# Altium footprint library IC.PCBLIB: 359 footprints (part 13 of 23)
Each footprint in its own frame and in the unit in brackets; x right, y up, seen from the top. Pads: shape width x height; smd on the part's side, far side on the other; paste and mask are expansions set on the pad; w line width, h text height; cw(c..) or ccw(c..) is an arc to the next point about the centre after c.
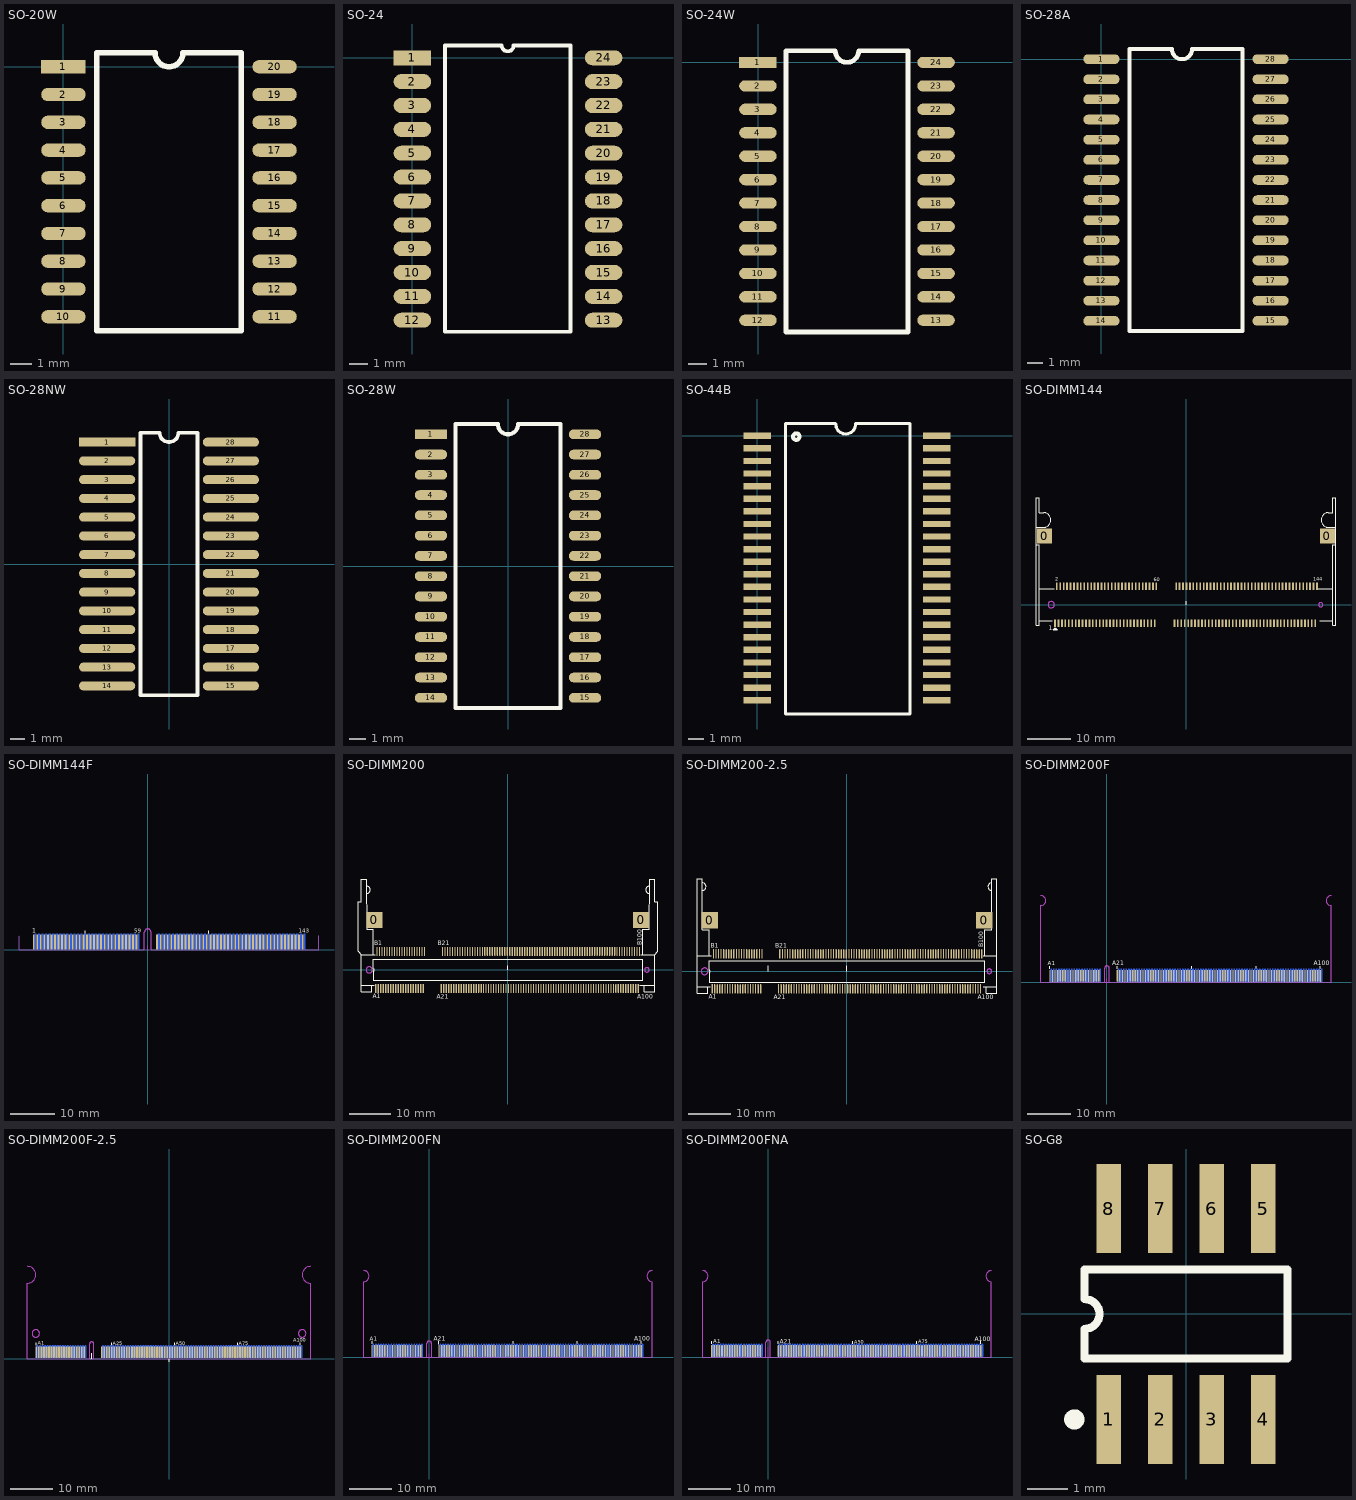
[diagram p12: the footprints below, top view; thin cyan lines are the x and y axes]

## SO-20W [mil]
pads (20):
  rect 80x24 smd: 1(0,0)
  oval 80x24 smd: 2(0,-50) 3(0,-100) 4(0,-150) 5(0,-200) 6(0,-250) 7(0,-300) 8(0,-350) 9(0,-400) 10(0,-450) 11(380,-450) 12(380,-400) 13(380,-350) 14(380,-300) 15(380,-250) 16(380,-200) 17(380,-150) 18(380,-100) 19(380,-50) 20(380,0)
TopOverlay:
  lines w10: 60,-475 320,-475 320,25 215,25 cw(c190,25) 165,25 60,25 60,-475

## SO-24 [mm]
pads (24):
  rect 2x0.8 smd: 1(0,0)
  oval 2x0.8 smd: 2(0,-1.27) 3(0,-2.54) 4(0,-3.81) 5(0,-5.08) 6(0,-6.35) 7(0,-7.62) 8(0,-8.89) 9(0,-10.16) 10(0,-11.43) 11(0,-12.7) 12(0,-13.97) 13(10.172,-13.97) 14(10.172,-12.7) 15(10.172,-11.43) 16(10.172,-10.16) 17(10.172,-8.89) 18(10.172,-7.62) 19(10.172,-6.35) 20(10.172,-5.08) 21(10.172,-3.81) 22(10.172,-2.54) 23(10.172,-1.27) 24(10.172,0)
TopOverlay:
  lines w0.2: 1.727,-14.58 8.407,-14.58 8.407,0.66 5.385,0.66 cw(c5.067,0.66) 4.75,0.66 1.727,0.66 1.727,-14.58

## SO-24W [mil]
pads (24):
  rect 80x24 smd: 1(-1,0)
  oval 80x24 smd: 2(-1,-50) 3(-1,-100) 4(-1,-150) 5(-1,-200) 6(-1,-250) 7(-1,-300) 8(-1,-350) 9(-1,-400) 10(-1,-450) 11(-1,-500) 12(-1,-550) 13(379,-550) 14(379,-500) 15(379,-450) 16(379,-400) 17(379,-350) 18(379,-300) 19(379,-250) 20(379,-200) 21(379,-150) 22(379,-100) 23(379,-50) 24(379,0)
TopOverlay:
  lines w10: 59,-575 319,-575 319,25 214,25 cw(c189,25) 164,25 59,25 59,-575

## SO-28A [mil]
pads (28):
  oval 90x24 smd: 1(0,0) 2(0,-50) 3(0,-100) 4(0,-150) 5(0,-200) 6(0,-250) 7(0,-300) 8(0,-350) 9(0,-400) 10(0,-450) 11(0,-500) 12(0,-550) 13(0,-600) 14(0,-650) 15(420,-650) 16(420,-600) 17(420,-550) 18(420,-500) 19(420,-450) 20(420,-400) 21(420,-350) 22(420,-300) 23(420,-250) 24(420,-200) 25(420,-150) 26(420,-100) 27(420,-50) 28(420,0)
TopOverlay:
  lines w10: 70,-675 350,-675 350,25 225,25 cw(c200,25) 175,25 70,25 70,-675

## SO-28NW [mil]
height 590.55
pads (28):
  rect 150x24 smd: 1(-165,325)
  oval 150x24 smd: 2(-165,275) 3(-165,225) 4(-165,175) 5(-165,125) 6(-165,75) 7(-165,25) 8(-165,-25) 9(-165,-75) 10(-165,-125) 11(-165,-175) 12(-165,-225) 13(-165,-275) 14(-165,-325) 15(165,-325) 16(165,-275) 17(165,-225) 18(165,-175) 19(165,-125) 20(165,-75) 21(165,-25) 22(165,25) 23(165,75) 24(165,125) 25(165,175) 26(165,225) 27(165,275) 28(165,325)
TopOverlay:
  lines w10: -76.3,350 -76.3,-350 76.3,-350 76.3,350 25,350 cw(c0,350) -25,350 -75,350

## SO-28W [mil]
pads (28):
  rect 80x24 smd: 1(-190,325)
  oval 80x24 smd: 2(-190,275) 3(-190,225) 4(-190,175) 5(-190,125) 6(-190,75) 7(-190,25) 8(-190,-25) 9(-190,-75) 10(-190,-125) 11(-190,-175) 12(-190,-225) 13(-190,-275) 14(-190,-325) 15(190,-325) 16(190,-275) 17(190,-225) 18(190,-175) 19(190,-125) 20(190,-75) 21(190,-25) 22(190,25) 23(190,75) 24(190,125) 25(190,175) 26(190,225) 27(190,275) 28(190,325)
TopOverlay:
  lines w10: -130,-350 130,-350 130,350 25,350 cw(c0,350) -25,350 -130,350 -130,-350

## SO-44B [mm]
pads (44):
  rect 1.75x0.4 smd: 1(0,0) 2(0,-0.8) 3(0,-1.6) 4(0,-2.4) 5(0,-3.2) 6(0,-4) 7(0,-4.8) 8(0,-5.6) 9(0,-6.4) 10(0,-7.2) 11(0,-8) 12(0,-8.8) 13(0,-9.6) 14(0,-10.4) 15(0,-11.2) 16(0,-12) 17(0,-12.8) 18(0,-13.6) 19(0,-14.4) 20(0,-15.2) 21(0,-16) 22(0,-16.8) 23(11.43,-16.8) 24(11.43,-16) 25(11.43,-15.2) 26(11.43,-14.4) 27(11.43,-13.6) 28(11.43,-12.8) 29(11.43,-12) 30(11.43,-11.2) 31(11.43,-10.4) 32(11.43,-9.6) 33(11.43,-8.8) 34(11.43,-8) 35(11.43,-7.2) 36(11.43,-6.4) 37(11.43,-5.6) 38(11.43,-4.8) 39(11.43,-4) 40(11.43,-3.2) 41(11.43,-2.4) 42(11.43,-1.6) 43(11.43,-0.8) 44(11.43,0)
TopOverlay:
  circle w0.25: c2.487,-0.051 r0.205
  lines w0.2: 4.978,0.784 1.803,0.784 1.803,-17.673 9.723,-17.673 9.723,0.784 6.248,0.784 ; 4.998,0.749 ccw(c5.633,0.749) 6.268,0.749

## SO-DIMM144 [mil]
pads (146):
  rect 137.8x137.8 smd: 0(-1298.05,630) 0(1298.05,630)
  rect 16x66 smd: 1(-1201.04,-170) 2(-1185.29,170) 3(-1169.55,-170) 4(-1153.8,170) 5(-1138.05,-170) 6(-1122.3,170) 7(-1106.55,-170) 8(-1090.81,170) 9(-1075.06,-170) 10(-1059.31,170) 11(-1043.56,-170) 12(-1027.81,170) 13(-1012.07,-170) 14(-996.32,170) 15(-980.57,-170) 16(-964.82,170) 17(-949.07,-170) 18(-933.33,170) 19(-917.58,-170) 20(-901.83,170) 21(-886.08,-170) 22(-870.33,170) 23(-854.59,-170) 24(-838.84,170) 25(-823.09,-170) 26(-807.34,170) 27(-791.59,-170) 28(-775.85,170) 29(-760.1,-170) 30(-744.35,170) 31(-728.6,-170) 32(-712.85,170) 33(-697.11,-170) 34(-681.36,170) 35(-665.61,-170) 36(-649.86,170) 37(-634.11,-170) 38(-618.37,170) 39(-602.62,-170) 40(-586.87,170) 41(-571.12,-170) 42(-555.37,170) 43(-539.63,-170) 44(-523.88,170) 45(-508.13,-170) 46(-492.38,170) 47(-476.63,-170) 48(-460.89,170) 49(-445.14,-170) 50(-429.39,170) 51(-413.64,-170) 52(-397.89,170) 53(-382.15,-170) 54(-366.4,170) 55(-350.65,-170) 56(-334.9,170) 57(-319.15,-170) 58(-303.41,170) 59(-287.66,-170) 60(-271.91,170) 61(-106.04,-170) 62(-90.29,170) 63(-74.55,-170) 64(-58.8,170) 65(-43.05,-170) 66(-27.3,170) 67(-11.55,-170) 68(4.19,170) 69(19.94,-170) 70(35.69,170) 71(51.44,-170) 72(67.19,170) 73(82.93,-170) 74(98.68,170) 75(114.43,-170) 76(130.18,170) 77(145.93,-170) 78(161.67,170) 79(177.42,-170) 80(193.17,170) 81(208.92,-170) 82(224.67,170) 83(240.41,-170) 84(256.16,170) 85(271.91,-170) 86(287.66,170) 87(303.41,-170) 88(319.15,170) 89(334.9,-170) 90(350.65,170) 91(366.4,-170) 92(382.15,170) 93(397.89,-170) 94(413.64,170) 95(429.39,-170) 96(445.14,170) 97(460.89,-170) 98(476.63,170) 99(492.38,-170) 100(508.13,170) 101(523.88,-170) 102(539.63,170) 103(555.37,-170) 104(571.12,170) 105(586.87,-170) 106(602.62,170) 107(618.37,-170) 108(634.11,170) 109(649.86,-170) 110(665.61,170) 111(681.36,-170) 112(697.11,170) 113(712.85,-170) 114(728.6,170) 115(744.35,-170) 116(760.1,170) 117(775.85,-170) 118(791.59,170) 119(807.34,-170) 120(823.09,170) 121(838.84,-170) 122(854.59,170) 123(870.33,-170) 124(886.08,170) 125(901.83,-170) 126(917.58,170) 127(933.33,-170) 128(949.07,170) 129(964.82,-170) 130(980.57,170) 131(996.32,-170) 132(1012.07,170) 133(1027.81,-170) 134(1043.56,170) 135(1059.31,-170) 136(1075.06,170) 137(1090.81,-170) 138(1106.55,170) 139(1122.3,-170) 140(1138.05,170) 141(1153.8,-170) 142(1169.55,170) 143(1185.29,-170) 144(1201.04,170)
TopOverlay:
  rectangle: -1208.05,-230 -1192.05,-218
  lines w10: -1375.05,710 -1346.05,710 -1306.05,710 ccw(c-1306.05,777) -1306.05,844 -1346.05,844 ; -1374.05,550 -1346.05,550 -1346.05,-190 -1376.05,-190 -1376.05,980 -1346.05,980 -1346.05,845 ; -1346.05,-146.46 -1226.05,-146.46 ; -1346.05,147 -1206.59,147 ; 0,0 0,32 ; 1206.59,147 1346.05,147 ; 1226.05,-146.46 1346.05,-146.46 ; 1346.05,844 1306.05,844 ccw(c1306.05,777) 1306.05,710 1346.05,710 1375.05,710 ; 1346.05,845 1346.05,980 1376.05,980 1376.05,-190 1346.05,-190 1346.05,550 1374.05,550 ; 1375.92,-146.46 1375.92,146.46 ; -1218.05,-230 -1200.05,-212 -1182.05,-230 -1218.05,-230
  text "144" at 1168.95,220 h35
  text "2" at -1198.05,221 h35
  text "1" at -1259.05,-233 h40
  text "60" at -294.05,216 h35
KeepOutLayer:
  circle w5: c-1236.22,0 r29.53
  circle w5: c1236.22,0 r19.68
Mechanical1:
  circle w5: c-1236.22,0 r29.53
  circle w5: c1236.22,0 r19.68

## SO-DIMM144F [mil]
pads (144):
  rect 16x130 smd: 1(-1012,70) 3(-980.5,70) 5(-949.01,70) 7(-917.51,70) 9(-886.02,70) 11(-854.52,70) 13(-823.02,70) 15(-791.53,70) 17(-760.03,70) 19(-728.54,70) 21(-697.04,70) 23(-665.54,70) 25(-634.05,70) 27(-602.55,70) 29(-571.06,70) 31(-539.56,70) 33(-508.06,70) 35(-476.57,70) 37(-445.07,70) 39(-413.58,70) 41(-382.08,70) 43(-350.58,70) 45(-319.09,70) 47(-287.59,70) 49(-256.1,70) 51(-224.6,70) 53(-193.1,70) 55(-161.61,70) 57(-130.11,70) 59(-98.62,70) 61(83,70) 63(114.5,70) 65(145.99,70) 67(177.49,70) 69(208.98,70) 71(240.48,70) 73(271.98,70) 75(303.47,70) 77(334.97,70) 79(366.46,70) 81(397.96,70) 83(429.46,70) 85(460.95,70) 87(492.45,70) 89(523.94,70) 91(555.44,70) 93(586.94,70) 95(618.43,70) 97(649.93,70) 99(681.42,70) 101(712.92,70) 103(744.42,70) 105(775.91,70) 107(807.41,70) 109(838.9,70) 111(870.4,70) 113(901.9,70) 115(933.39,70) 117(964.89,70) 119(996.38,70) 121(1027.88,70) 123(1059.38,70) 125(1090.87,70) 127(1122.37,70) 129(1153.86,70) 131(1185.36,70) 133(1216.86,70) 135(1248.35,70) 137(1279.85,70) 139(1311.34,70) 141(1342.84,70) 143(1374.34,70)
  rect 16x140 smd far side: 2(-996.25,75) 4(-964.76,75) 6(-933.26,75) 8(-901.76,75) 10(-870.27,75) 12(-838.77,75) 14(-807.28,75) 16(-775.78,75) 18(-744.28,75) 20(-712.79,75) 22(-681.29,75) 24(-649.8,75) 26(-618.3,75) 28(-586.8,75) 30(-555.31,75) 32(-523.81,75) 34(-492.32,75) 36(-460.82,75) 38(-429.32,75) 40(-397.83,75) 42(-366.33,75) 44(-334.84,75) 46(-303.34,75) 48(-271.84,75) 50(-240.35,75) 52(-208.85,75) 54(-177.36,75) 56(-145.86,75) 58(-114.36,75) 60(-82.87,75) 62(98.75,75) 64(130.24,75) 66(161.74,75) 68(193.24,75) 70(224.73,75) 72(256.23,75) 74(287.72,75) 76(319.22,75) 78(350.72,75) 80(382.21,75) 82(413.71,75) 84(445.2,75) 86(476.7,75) 88(508.2,75) 90(539.69,75) 92(571.19,75) 94(602.68,75) 96(634.18,75) 98(665.68,75) 100(697.17,75) 102(728.67,75) 104(760.16,75) 106(791.66,75) 108(823.16,75) 110(854.65,75) 112(886.15,75) 114(917.64,75) 116(949.14,75) 118(980.64,75) 120(1012.13,75) 122(1043.63,75) 124(1075.12,75) 126(1106.62,75) 128(1138.12,75) 130(1169.61,75) 132(1201.11,75) 134(1232.6,75) 136(1264.1,75) 138(1295.6,75) 140(1327.09,75) 142(1358.59,75) 144(1390.08,75)
TopOverlay:
  lines w10: -555,145 -555,170 ; 539,143 539,169
  text "143" at 1338,154 h35
  text "59" at -120,154 h35
  text "1" at -1023,154 h40
BottomOverlay:
  lines w10: -540,153 -540,178 ; 555,154 555,176
  text "2" at -984,157 h35
  text "144" at 1427,154 h35
KeepOutLayer:
  lines w5: -29,0 -29,157 cw(c0,157) 29,157 29,0 ; -11,0 10,0 ; 0,0 0,35
Mechanical1:
  lines w5: -1142,124.71 -1142,0 -29.53,0 ; -29,0 -29,157 cw(c0,157) 29,157 29,0 ; 29.53,0 1519,0 1519,124.71

## SO-DIMM200 [mm]
pads (202):
  rect 3.81x3.81 smd: 0(-32.004,11.989) 0(32.004,11.989)
  rect 0.3x2.2 smd: 1(-31.651,-4.47)
  oval 0.3x2.2 smd: 2(-31.351,4.43) 3(-31.052,-4.47) 4(-30.753,4.43) 5(-30.454,-4.47) 6(-30.154,4.43) 7(-29.855,-4.47) 8(-29.555,4.43) 9(-29.256,-4.47) 10(-28.956,4.43) 11(-28.657,-4.47) 12(-28.358,4.43) 13(-28.059,-4.47) 14(-27.759,4.43) 15(-27.46,-4.47) 16(-27.16,4.43) 17(-26.861,-4.47) 18(-26.561,4.43) 19(-26.262,-4.47) 20(-25.963,4.43) 21(-25.664,-4.47) 22(-25.364,4.43) 23(-25.065,-4.47) 24(-24.765,4.43) 25(-24.466,-4.47) 26(-24.166,4.43) 27(-23.867,-4.47) 28(-23.568,4.43) 29(-23.269,-4.47) 30(-22.969,4.43) 31(-22.67,-4.47) 32(-22.37,4.43) 33(-22.071,-4.47) 34(-21.772,4.43) 35(-21.473,-4.47) 36(-21.173,4.43) 37(-20.874,-4.47) 38(-20.574,4.43) 39(-20.275,-4.47) 40(-19.975,4.43) 41(-15.954,-4.47) 42(-15.654,4.43) 43(-15.355,-4.47) 44(-15.055,4.43) 45(-14.756,-4.47) 46(-14.457,4.43) 47(-14.158,-4.47) 48(-13.858,4.43) 49(-13.559,-4.47) 50(-13.259,4.43) 51(-12.96,-4.47) 52(-12.66,4.43) 53(-12.361,-4.47) 54(-12.062,4.43) 55(-11.763,-4.47) 56(-11.463,4.43) 57(-11.164,-4.47) 58(-10.864,4.43) 59(-10.565,-4.47) 60(-10.265,4.43) 61(-9.966,-4.47) 62(-9.667,4.43) 63(-9.368,-4.47) 64(-9.068,4.43) 65(-8.769,-4.47) 66(-8.469,4.43) 67(-8.17,-4.47) 68(-7.871,4.43) 69(-7.572,-4.47) 70(-7.272,4.43) 71(-6.973,-4.47) 72(-6.673,4.43) 73(-6.374,-4.47) 74(-6.074,4.43) 75(-5.775,-4.47) 76(-5.476,4.43) 77(-5.177,-4.47) 78(-4.877,4.43) 79(-4.578,-4.47) 80(-4.278,4.43) 81(-3.979,-4.47) 82(-3.679,4.43) 83(-3.38,-4.47) 84(-3.081,4.43) 85(-2.782,-4.47) 86(-2.482,4.43) 87(-2.183,-4.47) 88(-1.883,4.43) 89(-1.584,-4.47) 90(-1.284,4.43) 91(-0.985,-4.47) 92(-0.686,4.43) 93(-0.387,-4.47) 94(-0.087,4.43) 95(0.212,-4.47) 96(0.512,4.43) 97(0.811,-4.47) 98(1.11,4.43) 99(1.409,-4.47) 100(1.709,4.43) 101(2.008,-4.47) 102(2.308,4.43) 103(2.607,-4.47) 104(2.907,4.43) 105(3.206,-4.47) 106(3.505,4.43) 107(3.804,-4.47) 108(4.104,4.43) 109(4.403,-4.47) 110(4.703,4.43) 111(5.002,-4.47) 112(5.302,4.43) 113(5.601,-4.47) 114(5.9,4.43) 115(6.199,-4.47) 116(6.499,4.43) 117(6.798,-4.47) 118(7.098,4.43) 119(7.397,-4.47) 120(7.697,4.43) 121(7.996,-4.47) 122(8.295,4.43) 123(8.594,-4.47) 124(8.894,4.43) 125(9.193,-4.47) 126(9.493,4.43) 127(9.792,-4.47) 128(10.091,4.43) 129(10.391,-4.47) 130(10.69,4.43) 131(10.989,-4.47) 132(11.289,4.43) 133(11.588,-4.47) 134(11.888,4.43) 135(12.187,-4.47) 136(12.486,4.43) 137(12.785,-4.47) 138(13.085,4.43) 139(13.384,-4.47) 140(13.684,4.43) 141(13.983,-4.47) 142(14.283,4.43) 143(14.582,-4.47) 144(14.881,4.43) 145(15.18,-4.47) 146(15.48,4.43) 147(15.779,-4.47) 148(16.079,4.43) 149(16.378,-4.47) 150(16.678,4.43) 151(16.977,-4.47) 152(17.276,4.43) 153(17.575,-4.47) 154(17.875,4.43) 155(18.174,-4.47) 156(18.474,4.43) 157(18.773,-4.47) 158(19.073,4.43) 159(19.372,-4.47) 160(19.671,4.43) 161(19.97,-4.47) 162(20.27,4.43) 163(20.569,-4.47) 164(20.869,4.43) 165(21.168,-4.47) 166(21.467,4.43) 167(21.766,-4.47) 168(22.066,4.43) 169(22.365,-4.47) 170(22.665,4.43) 171(22.964,-4.47) 172(23.264,4.43) 173(23.563,-4.47) 174(23.862,4.43) 175(24.161,-4.47) 176(24.461,4.43) 177(24.76,-4.47) 178(25.06,4.43) 179(25.359,-4.47) 180(25.659,4.43) 181(25.958,-4.47) 182(26.257,4.43) 183(26.556,-4.47) 184(26.856,4.43) 185(27.155,-4.47) 186(27.455,4.43) 187(27.754,-4.47) 188(28.054,4.43) 189(28.353,-4.47) 190(28.652,4.43) 191(28.951,-4.47) 192(29.251,4.43) 193(29.55,-4.47) 194(29.85,4.43) 195(30.149,-4.47) 196(30.448,4.43) 197(30.747,-4.47) 198(31.047,4.43) 199(31.346,-4.47) 200(31.646,4.43)
TopOverlay:
  lines w0.2: -32.286,-2.535 32.412,-2.535 32.412,2.495 -32.286,2.495 -32.286,0.234 cw(c-32.286,-0.02) -32.286,-0.274 -32.286,-2.535
  lines w0.203: -33.886,18.313 ccw(c-33.886,19.202) -33.886,20.091 ; -32.616,-3.683 -32.616,-5.207 -35.156,-5.207 -35.156,-3.683 ; -32.286,3.683 -32.286,9.728 -33.861,9.728 -33.886,21.717 -35.156,21.717 -35.156,16.383 -35.918,16.383 -35.918,4.445 -35.156,3.683 ; -32.032,-3.683 -35.156,-3.683 ; -31.727,3.683 -35.156,3.683 ; 0,0 0,1.016 ; 31.671,-3.683 35.303,-3.683 ; 31.976,3.683 35.303,3.683 ; 32.433,3.683 32.433,9.728 34.008,9.728 34.033,21.717 35.303,21.717 35.303,16.383 36.065,16.383 36.065,4.445 35.303,3.683 ; 32.763,-3.683 32.763,-5.207 35.303,-5.207 35.303,-3.683 ; 34.033,18.313 cw(c34.033,19.202) 34.033,20.091 ; -35.156,-3.683 -35.156,3.683 ; 35.303,-3.683 35.303,3.683
  text "A100" at 31.036,-6.909 h1.02
  text "B100" at 32.21,5.883 h1.02
  text "A21" at -17.059,-6.873 h1.02
  text "A1" at -32.337,-6.805 h1.02
  text "B1" at -32.014,5.855 h1.02
  text "B21" at -16.744,5.883 h1.02
KeepOutLayer:
  circle w0.203: c33.401,0 r0.55
  circle w0.127: c-33.223,0 r0.75
Mechanical1:
  circle w0.203: c33.401,0 r0.55
  circle w0.127: c-33.223,0 r0.75

## SO-DIMM200-2.5 [mm]
pads (202):
  rect 3.81x3.81 smd: 0(-32.2,12) 0(32.2,12)
  rect 0.3x2.2 smd: 1(-31.65,-4.1)
  oval 0.3x2.2 smd: 2(-31.35,4.1) 3(-31.05,-4.1) 4(-30.75,4.1) 5(-30.45,-4.1) 6(-30.15,4.1) 7(-29.85,-4.1) 8(-29.55,4.1) 9(-29.25,-4.1) 10(-28.95,4.1) 11(-28.65,-4.1) 12(-28.35,4.1) 13(-28.05,-4.1) 14(-27.75,4.1) 15(-27.45,-4.1) 16(-27.15,4.1) 17(-26.85,-4.1) 18(-26.55,4.1) 19(-26.25,-4.1) 20(-25.95,4.1) 21(-25.65,-4.1) 22(-25.35,4.1) 23(-25.05,-4.1) 24(-24.75,4.1) 25(-24.45,-4.1) 26(-24.15,4.1) 27(-23.85,-4.1) 28(-23.55,4.1) 29(-23.25,-4.1) 30(-22.95,4.1) 31(-22.65,-4.1) 32(-22.35,4.1) 33(-22.05,-4.1) 34(-21.75,4.1) 35(-21.45,-4.1) 36(-21.15,4.1) 37(-20.85,-4.1) 38(-20.55,4.1) 39(-20.25,-4.1) 40(-19.95,4.1) 41(-16.05,-4.1) 42(-15.75,4.1) 43(-15.45,-4.1) 44(-15.15,4.1) 45(-14.852,-4.1) 46(-14.55,4.1) 47(-14.25,-4.1) 48(-13.95,4.1) 49(-13.65,-4.1) 50(-13.35,4.1) 51(-13.05,-4.1) 52(-12.75,4.1) 53(-12.45,-4.1) 54(-12.15,4.1) 55(-11.85,-4.1) 56(-11.55,4.1) 57(-11.25,-4.1) 58(-10.95,4.1) 59(-10.65,-4.1) 60(-10.35,4.1) 61(-10.05,-4.1) 62(-9.75,4.1) 63(-9.45,-4.1) 64(-9.15,4.1) 65(-8.85,-4.1) 66(-8.55,4.1) 67(-8.25,-4.1) 68(-7.95,4.1) 69(-7.65,-4.1) 70(-7.35,4.1) 71(-7.05,-4.1) 72(-6.75,4.1) 73(-6.45,-4.1) 74(-6.15,4.1) 75(-5.85,-4.1) 76(-5.55,4.1) 77(-5.25,-4.1) 78(-4.95,4.1) 79(-4.65,-4.1) 80(-4.35,4.1) 81(-4.05,-4.1) 82(-3.75,4.1) 83(-3.45,-4.1) 84(-3.15,4.1) 85(-2.85,-4.1) 86(-2.55,4.1) 87(-2.25,-4.1) 88(-1.95,4.1) 89(-1.65,-4.1) 90(-1.35,4.1) 91(-1.05,-4.1) 92(-0.75,4.1) 93(-0.45,-4.1) 94(-0.15,4.1) 95(0.15,-4.1) 96(0.45,4.1) 97(0.75,-4.1) 98(1.05,4.1) 99(1.35,-4.1) 100(1.65,4.1) 101(1.95,-4.1) 102(2.25,4.1) 103(2.55,-4.1) 104(2.85,4.1) 105(3.15,-4.1) 106(3.45,4.1) 107(3.75,-4.1) 108(4.05,4.1) 109(4.35,-4.1) 110(4.65,4.1) 111(4.95,-4.1) 112(5.25,4.1) 113(5.55,-4.1) 114(5.85,4.1) 115(6.15,-4.1) 116(6.45,4.1) 117(6.75,-4.1) 118(7.05,4.1) 119(7.35,-4.1) 120(7.65,4.1) 121(7.95,-4.1) 122(8.25,4.1) 123(8.55,-4.1) 124(8.85,4.1) 125(9.15,-4.1) 126(9.45,4.1) 127(9.75,-4.1) 128(10.05,4.1) 129(10.35,-4.1) 130(10.65,4.1) 131(10.95,-4.1) 132(11.25,4.1) 133(11.55,-4.1) 134(11.85,4.1) 135(12.15,-4.1) 136(12.45,4.1) 137(12.75,-4.1) 138(13.05,4.1) 139(13.35,-4.1) 140(13.65,4.1) 141(13.95,-4.1) 142(14.25,4.1) 143(14.55,-4.1) 144(14.85,4.1) 145(15.15,-4.1) 146(15.45,4.1) 147(15.75,-4.1) 148(16.05,4.1) 149(16.35,-4.1) 150(16.65,4.1) 151(16.95,-4.1) 152(17.25,4.1) 153(17.55,-4.1) 154(17.85,4.1) 155(18.15,-4.1) 156(18.45,4.1) 157(18.75,-4.1) 158(19.05,4.1) 159(19.35,-4.1) 160(19.65,4.1) 161(19.95,-4.1) 162(20.25,4.1) 163(20.55,-4.1) 164(20.85,4.1) 165(21.15,-4.1) 166(21.45,4.1) 167(21.75,-4.1) 168(22.05,4.1) 169(22.35,-4.1) 170(22.65,4.1) 171(22.95,-4.1) 172(23.25,4.1) 173(23.55,-4.1) 174(23.85,4.1) 175(24.15,-4.1) 176(24.45,4.1) 177(24.75,-4.1) 178(25.05,4.1) 179(25.35,-4.1) 180(25.65,4.1) 181(25.95,-4.1) 182(26.25,4.1) 183(26.55,-4.1) 184(26.85,4.1) 185(27.15,-4.1) 186(27.45,4.1) 187(27.75,-4.1) 188(28.05,4.1) 189(28.35,-4.1) 190(28.65,4.1) 191(28.95,-4.1) 192(29.25,4.1) 193(29.55,-4.1) 194(29.85,4.1) 195(30.15,-4.1) 196(30.45,4.1) 197(30.75,-4.1) 198(31.05,4.1) 199(31.35,-4.1) 200(31.65,4.1)
TopOverlay:
  lines w0.2: -32.382,-2.515 -32.382,-0.254 ccw(c-32.382,0) -32.382,0.254 -32.382,2.515 32.316,2.515 32.316,-2.515 -32.382,-2.515
  lines w0.203: -35.2,-3.663 -32.128,-3.663 ; -35.2,3.703 -31.823,3.703 ; -33.96,19 ccw(c-33.96,19.889) -33.96,20.778 ; -32.712,-3.663 -32.712,-5.187 -35.2,-5.187 -35.2,21.737 -33.96,21.737 -33.96,9.749 -32.382,9.749 -32.382,3.703 ; -18.45,0 -18.45,1.27 ; 0,0 0,1.27 ; 32,-3.663 35.2,-3.663 ; 32,3.703 35.207,3.703 ; 32.382,3.703 32.382,9.749 33.96,9.749 33.96,21.737 35.2,21.737 35.2,-5.187 32.667,-5.187 32.667,-3.663 ; 33.96,19 cw(c33.96,19.889) 33.96,20.778
  text "B1" at -31.95,5.55 h1.02
  text "A1" at -32.433,-6.434 h1.02
  text "B100" at 32,5.7 h1.02
  text "A100" at 30.7,-6.55 h1.02
  text "A21" at -17.2,-6.5 h1.02
  text "B21" at -16.84,5.553 h1.02
KeepOutLayer:
  circle w0.127: c-33.4,0.02 r0.8
  circle w0.203: c33.4,0.02 r0.55
Mechanical1:
  circle w0.127: c-33.4,0.02 r0.8
  circle w0.203: c33.4,0.02 r0.55

## SO-DIMM200F [mil]
pads (200):
  rect 12x110 smd: 1(-522.4,60)
  oval 12x120 smd far side: 2(-510.6,65) 4(-487.03,65) 6(-463.45,65) 8(-439.88,65) 10(-416.31,65) 12(-392.74,65) 14(-369.17,65) 16(-345.59,65) 18(-322.02,65) 20(-298.45,65) 22(-274.88,65) 24(-251.3,65) 26(-227.73,65) 28(-204.16,65) 30(-180.59,65) 32(-157.01,65) 34(-133.44,65) 36(-109.87,65) 38(-86.3,65) 40(-62.73,65) 42(107.4,65) 44(130.97,65) 46(154.55,65) 48(178.12,65) 50(201.69,65) 52(225.26,65) 54(248.84,65) 56(272.41,65) 58(295.98,65) 60(319.55,65) 62(343.12,65) 64(366.7,65) 66(390.27,65) 68(413.84,65) 70(437.41,65) 72(460.99,65) 74(484.56,65) 76(508.13,65) 78(531.7,65) 80(555.27,65) 82(578.85,65) 84(602.42,65) 86(625.99,65) 88(649.56,65) 90(673.13,65) 92(696.71,65) 94(720.28,65) 96(743.85,65) 98(767.42,65) 100(791,65) 102(814.57,65) 104(838.14,65) 106(861.71,65) 108(885.28,65) 110(908.86,65) 112(932.43,65) 114(956,65) 116(979.57,65) 118(1003.15,65) 120(1026.72,65) 122(1050.29,65) 124(1073.86,65) 126(1097.43,65) 128(1121.01,65) 130(1144.58,65) 132(1168.15,65) 134(1191.72,65) 136(1215.3,65) 138(1238.87,65) 140(1262.44,65) 142(1286.01,65) 144(1309.58,65) 146(1333.16,65) 148(1356.73,65) 150(1380.3,65) 152(1403.87,65) 154(1427.44,65) 156(1451.02,65) 158(1474.59,65) 160(1498.16,65) 162(1521.73,65) 164(1545.31,65) 166(1568.88,65) 168(1592.45,65) 170(1616.02,65) 172(1639.6,65) 174(1663.17,65) 176(1686.74,65) 178(1710.31,65) 180(1733.88,65) 182(1757.46,65) 184(1781.03,65) 186(1804.6,65) 188(1828.17,65) 190(1851.74,65) 192(1875.32,65) 194(1898.89,65) 196(1922.46,65) 198(1946.03,65) 200(1969.61,65)
  oval 12x110 smd: 3(-498.83,60) 5(-475.25,60) 7(-451.68,60) 9(-428.11,60) 11(-404.54,60) 13(-380.96,60) 15(-357.39,60) 17(-333.82,60) 19(-310.25,60) 21(-286.68,60) 23(-263.1,60) 25(-239.53,60) 27(-215.96,60) 29(-192.39,60) 31(-168.81,60) 33(-145.24,60) 35(-121.67,60) 37(-98.1,60) 39(-74.53,60) 41(95.6,60) 43(119.17,60) 45(142.75,60) 47(166.32,60) 49(189.89,60) 51(213.46,60) 53(237.03,60) 55(260.61,60) 57(284.18,60) 59(307.75,60) 61(331.32,60) 63(354.9,60) 65(378.47,60) 67(402.04,60) 69(425.61,60) 71(449.19,60) 73(472.76,60) 75(496.33,60) 77(519.9,60) 79(543.47,60) 81(567.05,60) 83(590.62,60) 85(614.19,60) 87(637.76,60) 89(661.34,60) 91(684.91,60) 93(708.48,60) 95(732.05,60) 97(755.62,60) 99(779.2,60) 101(802.77,60) 103(826.34,60) 105(849.91,60) 107(873.49,60) 109(897.06,60) 111(920.63,60) 113(944.2,60) 115(967.77,60) 117(991.35,60) 119(1014.92,60) 121(1038.49,60) 123(1062.06,60) 125(1085.63,60) 127(1109.21,60) 129(1132.78,60) 131(1156.35,60) 133(1179.92,60) 135(1203.49,60) 137(1227.07,60) 139(1250.64,60) 141(1274.21,60) 143(1297.78,60) 145(1321.36,60) 147(1344.93,60) 149(1368.5,60) 151(1392.07,60) 153(1415.64,60) 155(1439.22,60) 157(1462.79,60) 159(1486.36,60) 161(1509.93,60) 163(1533.51,60) 165(1557.08,60) 167(1580.65,60) 169(1604.22,60) 171(1627.8,60) 173(1651.37,60) 175(1674.94,60) 177(1698.51,60) 179(1722.08,60) 181(1745.66,60) 183(1769.23,60) 185(1792.8,60) 187(1816.37,60) 189(1839.94,60) 191(1863.52,60) 193(1887.09,60) 195(1910.66,60) 197(1934.23,60) 199(1957.81,60)
TopOverlay:
  lines w8: -522.23,125 -522.23,149 ; 94.77,123.8 94.77,147.8 ; 778.8,125 778.8,149 ; 1368.1,125 1368.1,149 ; 1957.41,125 1957.41,149
  text "A1" at -542.53,155 h36
  text "A21" at 48.27,154.5 h40
  text "A100" at 1895.57,156.4 h40
BottomOverlay:
  lines w8: -510.33,133.3 -510.33,159.3 ; 106.87,133.4 106.87,159.4 ; 790.8,133 790.8,159 ; 1380.1,133 1380.1,159 ; 1969.41,133 1969.41,159
  text "B100" at 2019.37,159.5 h36
  text "B21" at 96.17,138.8 h36
  text "B1" at -522.93,133.3 h36
KeepOutLayer:
  lines w5: -21.13,0 -21.13,130 cw(c-0.13,130) 20.87,130 20.87,0 ; -11,0 10,0 ; 0,0 0,35
  lines w8: -605,0 -605,705 ccw(c-605,750) -605,795 ; 2056,0 2056,705 cw(c2056,750) 2056,795
Mechanical1:
  lines w5: -21.13,0 -21.13,129 ; -21.13,130 cw(c-0.13,130) 20.87,130 20.87,0
  lines w8: -605,176 -605,0 ; -605,795 cw(c-605,750) -605,705 -605,0 ; 2056,795 ccw(c2056,750) 2056,705 2056,0 -605,0

## SO-DIMM200F-2.5 [mm]
pads (200):
  rect 0.4x2.8 smd: 1(-31.65,1.524)
  oval 0.4x3 smd far side: 2(-31.35,1.651) 4(-30.75,1.651) 6(-30.15,1.651) 8(-29.55,1.651) 10(-28.95,1.651) 12(-28.35,1.651) 14(-27.75,1.651) 16(-27.15,1.651) 18(-26.55,1.651) 20(-25.95,1.651) 22(-25.35,1.651) 24(-24.75,1.651) 26(-24.15,1.651) 28(-23.55,1.651) 30(-22.95,1.651) 32(-22.35,1.651) 34(-21.75,1.651) 36(-21.15,1.651) 38(-20.55,1.651) 40(-19.95,1.651) 42(-15.75,1.651) 44(-15.15,1.651) 46(-14.55,1.651) 48(-13.95,1.651) 50(-13.35,1.651) 52(-12.75,1.651) 54(-12.15,1.651) 56(-11.55,1.651) 58(-10.95,1.651) 60(-10.35,1.651) 62(-9.75,1.651) 64(-9.15,1.651) 66(-8.55,1.651) 68(-7.95,1.651) 70(-7.35,1.651) 72(-6.75,1.651) 74(-6.15,1.651) 76(-5.55,1.651) 78(-4.95,1.651) 80(-4.35,1.651) 82(-3.75,1.651) 84(-3.15,1.651) 86(-2.55,1.651) 88(-1.95,1.651) 90(-1.35,1.651) 92(-0.75,1.651) 94(-0.15,1.651) 96(0.45,1.651) 98(1.05,1.651) 100(1.65,1.651) 102(2.25,1.651) 104(2.85,1.651) 106(3.45,1.651) 108(4.05,1.651) 110(4.65,1.651) 112(5.25,1.651) 114(5.85,1.651) 116(6.45,1.651) 118(7.05,1.651) 120(7.65,1.651) 122(8.25,1.651) 124(8.85,1.651) 126(9.45,1.651) 128(10.05,1.651) 130(10.65,1.651) 132(11.25,1.651) 134(11.85,1.651) 136(12.45,1.651) 138(13.05,1.651) 140(13.65,1.651) 142(14.25,1.651) 144(14.85,1.651) 146(15.45,1.651) 148(16.05,1.651) 150(16.65,1.651) 152(17.25,1.651) 154(17.85,1.651) 156(18.45,1.651) 158(19.05,1.651) 160(19.65,1.651) 162(20.25,1.651) 164(20.85,1.651) 166(21.45,1.7) 168(22.05,1.651) 170(22.65,1.651) 172(23.25,1.651) 174(23.85,1.651) 176(24.45,1.651) 178(25.05,1.651) 180(25.65,1.651) 182(26.25,1.651) 184(26.85,1.651) 186(27.45,1.651) 188(28.05,1.651) 190(28.65,1.651) 192(29.25,1.651) 194(29.85,1.651) 196(30.45,1.651) 198(31.05,1.651) 200(31.65,1.651)
  oval 0.4x2.8 smd: 3(-31.05,1.524) 5(-30.45,1.524) 7(-29.85,1.524) 9(-29.25,1.524) 11(-28.65,1.524) 13(-28.05,1.524) 15(-27.45,1.524) 17(-26.85,1.524) 19(-26.25,1.524) 21(-25.65,1.524) 23(-25.05,1.524) 25(-24.45,1.524) 27(-23.85,1.524) 29(-23.25,1.524) 31(-22.65,1.524) 33(-22.05,1.524) 35(-21.45,1.524) 37(-20.85,1.524) 39(-20.25,1.524) 41(-16.05,1.524) 43(-15.45,1.524) 45(-14.85,1.524) 47(-14.25,1.524) 49(-13.65,1.524) 51(-13.05,1.524) 53(-12.45,1.524) 55(-11.85,1.524) 57(-11.25,1.524) 59(-10.65,1.524) 61(-10.05,1.524) 63(-9.45,1.524) 65(-8.85,1.524) 67(-8.25,1.524) 69(-7.65,1.524) 71(-7.05,1.524) 73(-6.45,1.524) 75(-5.85,1.524) 77(-5.25,1.524) 79(-4.65,1.524) 81(-4.05,1.524) 83(-3.45,1.524) 85(-2.85,1.524) 87(-2.25,1.524) 89(-1.65,1.524) 91(-1.05,1.524) 93(-0.45,1.524) 95(0.15,1.524) 97(0.75,1.524) 99(1.35,1.524) 101(1.95,1.524) 103(2.55,1.524) 105(3.15,1.524) 107(3.75,1.524) 109(4.35,1.524) 111(4.95,1.524) 113(5.55,1.524) 115(6.15,1.524) 117(6.75,1.524) 119(7.35,1.524) 121(7.95,1.524) 123(8.55,1.524) 125(9.15,1.524) 127(9.75,1.524) 129(10.35,1.524) 131(10.95,1.524) 133(11.55,1.524) 135(12.15,1.524) 137(12.75,1.524) 139(13.35,1.524) 141(13.95,1.524) 143(14.55,1.524) 145(15.15,1.524) 147(15.75,1.524) 149(16.35,1.524) 151(16.95,1.524) 153(17.55,1.524) 155(18.15,1.524) 157(18.75,1.524) 159(19.35,1.524) 161(19.95,1.524) 163(20.55,1.524) 165(21.15,1.524) 167(21.75,1.524) 169(22.35,1.524) 171(22.95,1.524) 173(23.55,1.524) 175(24.15,1.524) 177(24.75,1.524) 179(25.35,1.524) 181(25.95,1.524) 183(26.55,1.524) 185(27.15,1.524) 187(27.75,1.524) 189(28.35,1.524) 191(28.95,1.524) 193(29.55,1.524) 195(30.15,1.524) 197(30.75,1.524) 199(31.35,1.524)
TopOverlay:
  lines w0.203: -31.715,3.175 -31.715,3.785 ; -18.45,0 -18.45,1.27 ; -13.65,3.15 -13.65,3.76 ; 0,-0.7 0,0 ; 1.35,3.14 1.35,3.75 ; 16.35,3.19 16.35,3.8 ; 31.35,3.15 31.35,3.76
  text "A100" at 29.698,3.973 h0.91
  text "A1" at -31.3,3.3 h0.91
  text "A25" at -13.4,3.2 h0.91
  text "A50" at 1.6,3.2 h0.91
  text "A75" at 16.6,3.2 h0.91
BottomOverlay:
  lines w0.203: -31.412,3.386 -31.412,4.046 ; -13.35,3.35 -13.35,4.01 ; 1.65,3.39 1.65,4.05 ; 16.65,3.39 16.65,4.05 ; 31.65,3.4 31.65,4.06
  text "B1" at -31.75,3.5 h0.91
  text "B25" at -13.7,3.4 h0.91
  text "B100" at 31.4,3.5 h0.91
  text "B50" at 1.3,3.4 h0.91
  text "B75" at 16.3,3.4 h0.91
KeepOutLayer:
  circle w0.127: c31.8,6 r0.9
  circle w0.127: c-31.8,6 r0.9
  lines w0.127: -18.95,0 -18.95,3.5 cw(c-18.45,3.5) -17.95,3.5 -17.95,0.198 ; -18.729,0 -18.196,0 ; -18.45,0 -18.45,0.889
  lines w0.203: -33.8,0 -33.8,18 ccw(c-33.8,20) -33.8,22 ; 33.8,0 33.8,18 cw(c33.8,20) 33.8,22
Mechanical1:
  circle w0.127: c31.8,6 r0.9
  circle w0.127: c-31.8,6 r0.9
  lines w0.127: -18.95,0 -18.95,3.5 cw(c-18.45,3.5) -17.95,3.5 -17.95,0
  lines w0.203: -33.8,4.47 -33.8,0 ; -33.8,22 cw(c-33.8,20) -33.8,18 -33.8,0 ; 33.772,0 -33.8,0 ; 33.8,4.47 33.8,0 33.8,18 cw(c33.8,20) 33.8,22

## SO-DIMM200FN [mil]
pads (200):
  rect 12x110 smd: 1(-526.67,60)
  oval 12x120 smd far side: 2(-514.87,65) 4(-491.3,65) 6(-467.73,65) 8(-444.15,65) 10(-420.58,65) 12(-397.01,65) 14(-373.44,65) 16(-349.87,65) 18(-326.29,65) 20(-302.72,65) 22(-279.15,65) 24(-255.58,65) 26(-232.01,65) 28(-208.43,65) 30(-184.86,65) 32(-161.29,65) 34(-137.72,65) 36(-114.14,65) 38(-90.57,65) 40(-67,65) 42(102.4,65) 44(125.97,65) 46(149.55,65) 48(173.12,65) 50(196.69,65) 52(220.26,65) 54(243.84,65) 56(267.41,65) 58(290.98,65) 60(314.55,65) 62(338.12,65) 64(361.7,65) 66(385.27,65) 68(408.84,65) 70(432.41,65) 72(455.99,65) 74(479.56,65) 76(503.13,65) 78(526.7,65) 80(550.27,65) 82(573.85,65) 84(597.42,65) 86(620.99,65) 88(644.56,65) 90(668.13,65) 92(691.71,65) 94(715.28,65) 96(738.85,65) 98(762.42,65) 100(786,65) 102(809.57,65) 104(833.14,65) 106(856.71,65) 108(880.28,65) 110(903.86,65) 112(927.43,65) 114(951,65) 116(974.57,65) 118(998.15,65) 120(1021.72,65) 122(1045.29,65) 124(1068.86,65) 126(1092.43,65) 128(1116.01,65) 130(1139.58,65) 132(1163.15,65) 134(1186.72,65) 136(1210.3,65) 138(1233.87,65) 140(1257.44,65) 142(1281.01,65) 144(1304.58,65) 146(1328.16,65) 148(1351.73,65) 150(1375.3,65) 152(1398.87,65) 154(1422.44,65) 156(1446.02,65) 158(1469.59,65) 160(1493.16,65) 162(1516.73,65) 164(1540.31,65) 166(1563.88,65) 168(1587.45,65) 170(1611.02,65) 172(1634.6,65) 174(1658.17,65) 176(1681.74,65) 178(1705.31,65) 180(1728.88,65) 182(1752.46,65) 184(1776.03,65) 186(1799.6,65) 188(1823.17,65) 190(1846.74,65) 192(1870.32,65) 194(1893.89,65) 196(1917.46,65) 198(1941.03,65) 200(1964.61,65)
  oval 12x110 smd: 3(-503.1,60) 5(-479.53,60) 7(-455.95,60) 9(-432.38,60) 11(-408.81,60) 13(-385.24,60) 15(-361.67,60) 17(-338.09,60) 19(-314.52,60) 21(-290.95,60) 23(-267.38,60) 25(-243.81,60) 27(-220.23,60) 29(-196.66,60) 31(-173.09,60) 33(-149.52,60) 35(-125.94,60) 37(-102.37,60) 39(-78.8,60) 41(90.6,60) 43(114.17,60) 45(137.75,60) 47(161.32,60) 49(184.89,60) 51(208.46,60) 53(232.03,60) 55(255.61,60) 57(279.18,60) 59(302.75,60) 61(326.32,60) 63(349.9,60) 65(373.47,60) 67(397.04,60) 69(420.61,60) 71(444.19,60) 73(467.76,60) 75(491.33,60) 77(514.9,60) 79(538.47,60) 81(562.05,60) 83(585.62,60) 85(609.19,60) 87(632.76,60) 89(656.34,60) 91(679.91,60) 93(703.48,60) 95(727.05,60) 97(750.62,60) 99(774.2,60) 101(797.77,60) 103(821.34,60) 105(844.91,60) 107(868.49,60) 109(892.06,60) 111(915.63,60) 113(939.2,60) 115(962.77,60) 117(986.35,60) 119(1009.92,60) 121(1033.49,60) 123(1057.06,60) 125(1080.63,60) 127(1104.21,60) 129(1127.78,60) 131(1151.35,60) 133(1174.92,60) 135(1198.49,60) 137(1222.07,60) 139(1245.64,60) 141(1269.21,60) 143(1292.78,60) 145(1316.36,60) 147(1339.93,60) 149(1363.5,60) 151(1387.07,60) 153(1410.64,60) 155(1434.22,60) 157(1457.79,60) 159(1481.36,60) 161(1504.93,60) 163(1528.51,60) 165(1552.08,60) 167(1575.65,60) 169(1599.22,60) 171(1622.8,60) 173(1646.37,60) 175(1669.94,60) 177(1693.51,60) 179(1717.08,60) 181(1740.66,60) 183(1764.23,60) 185(1787.8,60) 187(1811.37,60) 189(1834.94,60) 191(1858.52,60) 193(1882.09,60) 195(1905.66,60) 197(1929.23,60) 199(1952.81,60)
TopOverlay:
  lines w8: -526.5,125 -526.5,149 ; 89.77,123.8 89.77,147.8 ; 773.8,125 773.8,149 ; 1363.1,125 1363.1,149 ; 1952.41,125 1952.41,149
  text "A100" at 1890.57,156.4 h40
  text "A21" at 43.27,154.5 h40
  text "A1" at -546.8,155 h36
BottomOverlay:
  lines w8: -514.6,133.3 -514.6,159.3 ; 101.87,133.4 101.87,159.4 ; 785.8,133 785.8,159 ; 1375.1,133 1375.1,159 ; 1964.41,133 1964.41,159
  text "B1" at -527.2,133.3 h36
  text "B21" at 92,149 h36
  text "B100" at 2014.37,159.5 h36
KeepOutLayer:
  lines w5: -21.13,0 -21.13,130 cw(c-0.13,130) 20.87,130 20.87,0 ; -11,0 10,0 ; 0,0 0,35
  lines w8: -605,0 -605,698.82 ccw(c-605,750) -605,801.18 ; 2056,0 2056,698.82 cw(c2056,750) 2056,801.18
Mechanical1:
  lines w5: -21.13,0 -21.13,129 ; -21.13,130 cw(c-0.13,130) 20.87,130 20.87,0
  lines w8: -605,176 -605,0 ; -605,801.18 cw(c-605,750) -605,698.82 -605,0 ; 2056,801.18 ccw(c2056,750) 2056,698.82 2056,0 -605,0

## SO-DIMM200FNA [mil]
pads (200):
  rect 14x110 smd: 1(-519.68,60)
  oval 14x120 smd far side: 2(-507.87,65) 4(-484.25,65) 6(-460.63,65) 8(-437.01,65) 10(-413.38,65) 12(-389.76,65) 14(-366.14,65) 16(-342.52,65) 18(-318.9,65) 20(-295.27,65) 22(-271.65,65) 24(-248.03,65) 26(-224.41,65) 28(-200.79,65) 30(-177.16,65) 32(-153.54,65) 34(-129.92,65) 36(-106.3,65) 38(-82.68,65) 40(-59.05,65) 42(106.3,65) 44(129.92,65) 46(153.54,65) 48(177.17,65) 50(200.79,65) 52(224.41,65) 54(248.03,65) 56(271.65,65) 58(295.28,65) 60(318.9,65) 62(342.52,65) 64(366.14,65) 66(389.76,65) 68(413.39,65) 70(437.01,65) 72(460.63,65) 74(484.25,65) 76(507.87,65) 78(531.5,65) 80(555.12,65) 82(578.74,65) 84(602.36,65) 86(625.98,65) 88(649.61,65) 90(673.23,65) 92(696.85,65) 94(720.47,65) 96(744.09,65) 98(767.72,65) 100(791.34,65) 102(814.96,65) 104(838.58,65) 106(862.2,65) 108(885.83,65) 110(909.45,65) 112(933.07,65) 114(956.69,65) 116(980.31,65) 118(1003.94,65) 120(1027.56,65) 122(1051.18,65) 124(1074.8,65) 126(1098.42,65) 128(1122.05,65) 130(1145.67,65) 132(1169.29,65) 134(1192.91,65) 136(1216.53,65) 138(1240.16,65) 140(1263.78,65) 142(1287.4,65) 144(1311.02,65) 146(1334.64,65) 148(1358.27,65) 150(1381.89,65) 152(1405.51,65) 154(1429.13,65) 156(1452.75,65) 158(1476.38,65) 160(1500,65) 162(1523.62,65) 164(1547.24,65) 166(1570.86,65) 168(1594.49,65) 170(1618.11,65) 172(1641.73,65) 174(1665.35,65) 176(1688.97,65) 178(1712.6,65) 180(1736.22,65) 182(1759.84,65) 184(1783.46,65) 186(1807.08,65) 188(1830.71,65) 190(1854.33,65) 192(1877.95,65) 194(1901.57,65) 196(1925.19,65) 198(1948.82,65) 200(1972.44,65)
  oval 14x110 smd: 3(-496.06,60) 5(-472.44,60) 7(-448.82,60) 9(-425.2,60) 11(-401.57,60) 13(-377.95,60) 15(-354.33,60) 17(-330.71,60) 19(-307.09,60) 21(-283.46,60) 23(-259.84,60) 25(-236.22,60) 27(-212.6,60) 29(-188.98,60) 31(-165.35,60) 33(-141.73,60) 35(-118.11,60) 37(-94.49,60) 39(-70.87,60) 41(94.49,60) 43(118.11,60) 45(141.73,60) 47(165.35,60) 49(188.98,60) 51(212.6,60) 53(236.22,60) 55(259.84,60) 57(283.46,60) 59(307.09,60) 61(330.71,60) 63(354.33,60) 65(377.95,60) 67(401.57,60) 69(425.2,60) 71(448.82,60) 73(472.44,60) 75(496.06,60) 77(519.69,60) 79(543.31,60) 81(566.93,60) 83(590.55,60) 85(614.17,60) 87(637.8,60) 89(661.42,60) 91(685.04,60) 93(708.66,60) 95(732.28,60) 97(755.91,60) 99(779.53,60) 101(803.15,60) 103(826.77,60) 105(850.39,60) 107(874.02,60) 109(897.64,60) 111(921.26,60) 113(944.88,60) 115(968.5,60) 117(992.13,60) 119(1015.75,60) 121(1039.37,60) 123(1062.99,60) 125(1086.61,60) 127(1110.24,60) 129(1133.86,60) 131(1157.48,60) 133(1181.1,60) 135(1204.72,60) 137(1228.35,60) 139(1251.97,60) 141(1275.59,60) 143(1299.21,60) 145(1322.83,60) 147(1346.46,60) 149(1370.08,60) 151(1393.7,60) 153(1417.32,60) 155(1440.94,60) 157(1464.57,60) 159(1488.19,60) 161(1511.81,60) 163(1535.43,60) 165(1559.06,60) 167(1582.68,60) 169(1606.3,60) 171(1629.92,60) 173(1653.54,60) 175(1677.17,60) 177(1700.79,60) 179(1724.41,60) 181(1748.03,60) 183(1771.65,60) 185(1795.28,60) 187(1818.9,60) 189(1842.52,60) 191(1866.14,60) 193(1889.76,60) 195(1913.39,60) 197(1937.01,60) 199(1960.63,60)
TopOverlay:
  lines w8: -519.68,125 -519.68,149 ; 94.49,125 94.49,149 ; 779.53,125 779.53,149 ; 1370.08,125 1370.08,149 ; 1960.63,125 1960.63,149
  text "A75" at 1381.89,130 h32
  text "A50" at 791.34,125 h32
  text "A1" at -507.87,130 h36
  text "A21" at 106.3,125 h40
  text "A100" at 1901.57,150 h40
BottomOverlay:
  lines w8: -507.87,134 -507.87,160 ; 106.3,134 106.3,160 ; 791.34,134 791.34,160 ; 1381.89,134 1381.89,160 ; 1972.44,135 1972.44,161
  text "B75" at 1370.08,135 h32
  text "B50" at 779.53,135 h32
  text "B100" at 1960.63,135 h36
  text "B21" at 94.49,145 h36
  text "B1" at -519.68,135 h36
KeepOutLayer:
  lines w5: -20,0 -20,140 cw(c0,140) 20,140 20,0 ; -11,0 10,0 ; 0,0 0,35
  lines w7: 0,35 0,93
  lines w8: -604.33,0 -604.33,698.82 ccw(c-604.33,750) -604.33,801.18 ; 2057.09,0 2057.09,698.82 cw(c2057.09,750) 2057.09,801.18
Mechanical1:
  lines w5: -20,0 -20,140 cw(c0,140) 20,140 20,0
  lines w8: -604.33,801.18 cw(c-604.33,750) -604.33,698.82 -604.33,0 2057.09,0 2057.09,698.82 cw(c2057.09,750) 2057.09,801.18

## SO-G8 [mm]
pads (8):
  rect 0.6x2.2 smd: 1(-1.905,-2.6) 2(-0.635,-2.6) 3(0.635,-2.6) 4(1.905,-2.6) 5(1.905,2.6) 6(0.635,2.6) 7(-0.635,2.6) 8(-1.905,2.6)
TopOverlay:
  circle w0.25: c-2.755,-2.6 r0.125
  lines w0.2: -2.5,-1.1 2.5,-1.1 2.5,1.1 -2.5,1.1 -2.5,0.367 cw(c-2.5,0) -2.5,-0.367 -2.5,-1.1